# Altium footprint library transistors.PcbLib: 40 footprints (part 2 of 3)
Each footprint in its own frame and in the unit in brackets; x right, y up, seen from the top. Pads: shape width x height; smd on the part's side, far side on the other; paste and mask are expansions set on the pad; w line width, h text height; cw(c..) or ccw(c..) is an arc to the next point about the centre after c.
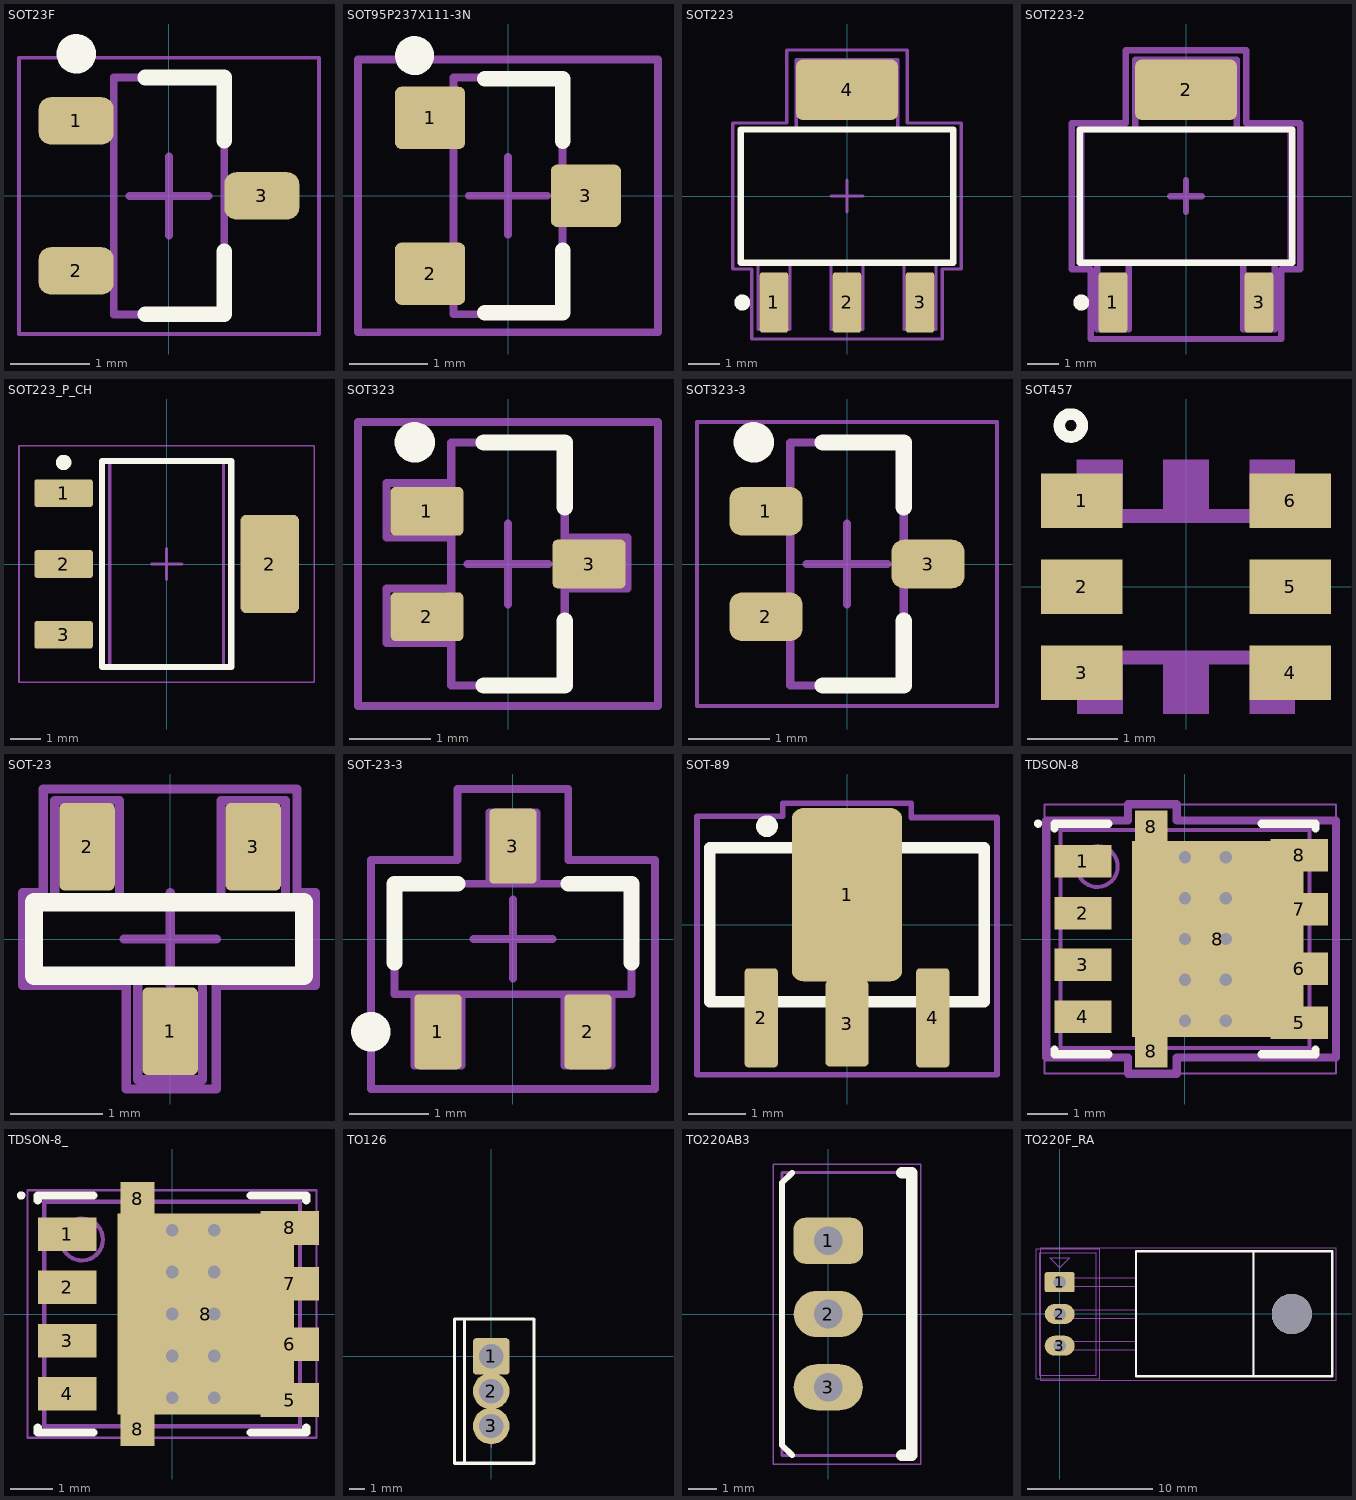
[diagram p1: the footprints below, top view; thin cyan lines are the x and y axes]

## SOT23F [mm] "SOT23-3, IPC Medium Density"
height 1.1
pads (3):
  rrect50% 0.95x0.6 smd: 1(-1.175,0.95) 2(-1.175,-0.95) 3(1.175,0)
Top Overlay:
  circle w0.25: c-1.175,1.8 r0.125
  lines w0.2: -0.3,-1.5 0.7,-1.5 0.7,-0.7 ; -0.3,1.5 0.7,1.5 0.7,0.7
Mechanical 13:
  lines w0.1: -0.7,-1.5 0.7,-1.5 0.7,1.5 -0.7,1.5 -0.7,-1.5
Mechanical 15:
  lines w0.05: -1.9,-1.75 1.9,-1.75 1.9,1.75 -1.9,1.75 -1.9,-1.75
  lines w0.1: -0.5,0 0.5,0 ; 0,-0.5 0,0.5
3D body "SOT23-3.step": height 1.3, standoff 0, extent -1.5,-1.5 1.5,1.5

## SOT95P237X111-3N [mm] "BC846ALT1G, SOT23, 3-Leads, Body 2,92x2,37mm, Pitch 0,95mm, IPC Medium Density"
height 1.11
pads (3):
  rrect20% 0.9x0.8 smd: 1(-1,1) 2(-1,-1) 3(1,0)
Top Overlay:
  circle w0.25: c-1.2,1.8 r0.125
  lines w0.2: -0.3,-1.5 0.7,-1.5 0.7,-0.7 ; -0.3,1.5 0.7,1.5 0.7,0.7
M3_comm_top:
  text ".comment" at -1.7,-0.4 h1
M5_asm_top:
  lines w0.1: -0.7,-1.52 0.7,-1.52 0.7,1.52 -0.7,1.52 -0.7,-1.52
  text ".Designator" at -1.9,2 h1
M7_courtyard_top:
  lines w0.1: -0.5,0 0.5,0 ; 0,-0.5 0,0.5 ; -1.925,-1.75 1.925,-1.75 1.925,1.75 -1.925,1.75 -1.925,-1.75
3D body "SOT95P237X111-3N.step": height 1.11, standoff 0, extent -1.32,-1.52 1.32,1.52

## SOT223 [mm] "SOT223, 4-Leads, Body 6.5x3.5mm, Pitch 2.3mm, IPC Low Density"
height 1.8
pads (4):
  rrect20% 0.9x1.9 smd: 1(-2.3,-3.35) 2(0,-3.35) 3(2.3,-3.35)
  rrect20% 3.2x1.9 smd: 4(0,3.35)
Top Overlay:
  circle w0.25: c-3.3,-3.35 r0.125
  lines w0.2: -3.35,-2.1 3.35,-2.1 3.35,2.1 -3.35,2.1 -3.35,-2.1
M3_comm_top:
  text ".comment" at -1.3,-0.3 h1
M5_asm_top:
  lines w0.1: -2.8,-2.1 -2.8,-4.2 -1.8,-4.2 -1.8,-2.1 ; -1.6,2.1 -1.6,4.1 -1.6,4.3 1.6,4.3 1.6,2.1 ; -0.5,-2.1 -0.5,-4.2 0.5,-4.2 0.5,-2.1 ; 1.8,-2.1 1.8,-4.2 2.8,-4.2 2.8,-2.1 ; -3.3,-2.1 3.3,-2.1 3.3,2.1 -3.3,2.1 -3.3,-2.1
  text ".Designator" at -1.6,4.9 h1
M7_courtyard_top:
  lines w0.1: -0.5,0 0.5,0 ; 0,-0.5 0,0.5 ; -3.6,-2.3 -3,-2.3 -3,-4.5 3,-4.5 3,-2.3 3.6,-2.3 3.6,2.3 1.9,2.3 1.9,4.6 -1.9,4.6 -1.9,2.3 -3.6,2.3 -3.6,-2.3
3D body "SOT-223-2.STEP": height 1.95, standoff 0.05, extent -3.302,-3.574 3.398,3.63

## SOT223-2 [mm] "IPN50R950CEATMA1"
height 1.8
pads (3):
  rrect20% 0.9x1.9 smd: 1(-2.3,-3.35) 3(2.3,-3.35)
  rrect20% 3.2x1.9 smd: 2(0,3.35)
Top Overlay:
  circle w0.25: c-3.3,-3.35 r0.125
  lines w0.2: -3.35,-2.1 -3.35,2.1 3.35,2.1 3.35,-2.1 -3.35,-2.1
M3_comm_top:
  text ".comment" at -3,-0.5 h2
M5_asm_top:
  lines w0.2: -2.8,-2.1 -2.8,-4.2 -1.8,-4.2 -1.8,-2.1 ; -1.6,2.1 -1.6,4.1 -1.6,4.3 1.6,4.3 1.6,2.1 ; 1.8,-2.1 1.8,-4.2 2.8,-4.2 2.8,-2.1 ; -3.3,-2.1 -3.3,2.1 3.3,2.1 3.3,-2.1 -3.3,-2.1
  text ".Designator" at -3.6,4.8 h2
M7_courtyard_top:
  lines w0.2: -0.5,0 0.5,0 ; 0,-0.5 0,0.5 ; -3.6,-2.3 -3.6,2.3 -1.9,2.3 -1.9,4.6 1.9,4.6 1.9,2.3 3.6,2.3 3.6,-2.3 3,-2.3 3,-4.5 -3,-4.5 -3,-2.3 -3.6,-2.3
3D body "SOT-223-2.STEP": height 1.95, standoff 0.05, extent -3.302,-3.574 3.398,3.63

## SOT223_P_CH [mm] "P-channel IRFL9014"
height 1.8
pads (4):
  rrect20% 1.9x0.9 smd: 1(-3.35,2.3) 2(-3.35,0) 3(-3.35,-2.3)
  rrect20% 1.9x3.2 smd: 2(3.35,0)
Top Overlay:
  circle w0.25: c-3.35,3.3 r0.125
  lines w0.2: -2.1,-3.35 -2.1,3.35 2.1,3.35 2.1,-3.35 -2.1,-3.35
Mechanical 13:
  lines w0.1: -1.85,-3.35 -1.85,3.35 1.85,3.35 1.85,-3.35 -1.85,-3.35
Mechanical 15:
  lines w0.05: -4.8,-3.85 -4.8,3.85 4.8,3.85 4.8,-3.85 -4.8,-3.85
  lines w0.1: -0.5,0 0.5,0 ; 0,-0.5 0,0.5
3D body "SOT-223-2.STEP": height 1.95, standoff 0.05, extent -3.574,-3.398 3.63,3.302

## SOT323 [mm] "1PS70SB44,115, DIODE ARRAY SCHOTTKY 40V SOT323"
height 1.1
pads (3):
  rrect20% 0.9x0.6 smd: 1(-1,0.65) 2(-1,-0.65) 3(1,0)
Top Overlay:
  circle w0.25: c-1.15,1.5 r0.125
  lines w0.2: -0.3,-1.5 0.7,-1.5 0.7,-0.7 ; -0.3,1.5 0.7,1.5 0.7,0.7
M3_comm_top:
  text ".comment" at -1.7,-0.4 h1
M5_asm_top:
  lines w0.1: -0.75,-0.3 -1.5,-0.3 -1.5,-0.975 -0.7,-0.975 ; -0.725,1 -1.5,1 -1.5,0.325 -0.7,0.325 ; 0.7,-0.3 1.475,-0.3 1.475,0.325 0.7,0.325 ; -0.7,-1.5 -0.7,1.5 0.7,1.5 0.7,-1.5 -0.7,-1.5
  text ".Designator" at -1.875,1.8 h1
M7_courtyard_top:
  lines w0.1: -0.5,0 0.5,0 ; 0,-0.5 0,0.5 ; -1.85,-1.75 1.85,-1.75 1.85,1.75 -1.85,1.75 -1.85,-1.75
Mechanical 13:
  lines w0.1: -0.7,-1.5 0.7,-1.5 0.7,1.5 -0.7,1.5 -0.7,-1.5
Mechanical 15:
  lines w0.1: -0.5,0 0.5,0 ; 0,-0.5 0,0.5
3D body "SOT323 (SC70-3)-1.STEP": height 1.1, standoff 0, extent -1.122,-1.1 1.123,1.1

## SOT323-3 [mm] "SOT323-3, IPC Medium Density"
height 1.1
pads (3):
  rrect50% 0.9x0.6 smd: 1(-1,0.65) 2(-1,-0.65) 3(1,0)
Top Overlay:
  circle w0.25: c-1.15,1.5 r0.125
  lines w0.2: -0.3,-1.5 0.7,-1.5 0.7,-0.7 ; -0.3,1.5 0.7,1.5 0.7,0.7
Mechanical 13:
  lines w0.1: -0.7,-1.5 -0.7,1.5 0.7,1.5 0.7,-1.5 -0.7,-1.5
Mechanical 15:
  lines w0.05: -1.85,-1.75 -1.85,1.75 1.85,1.75 1.85,-1.75 -1.85,-1.75
  lines w0.1: -0.5,0 0.5,0 ; 0,-0.5 0,0.5
3D body "SOT323 (SC70-3)-1.STEP": height 1.1, standoff 0, extent -1.122,-1.1 1.123,1.1

## SOT457 [mm]
pads (6):
  rect 0.9x0.6 smd: 1(-1.15,0.95) 2(-1.15,0) 3(-1.15,-0.95) 4(1.15,-0.95) 5(1.15,0) 6(1.15,0.95)
Top Overlay:
  circle w0.127: c-1.27,1.778 r0.127
M1_3D_TOP:
  region: -1.203,1.4 -0.7,1.4 -0.7,0.802 -1.203,0.802
  region: -0.25,1.4 0.25,1.4 0.25,0.801 -0.25,0.801
  region: 0.701,1.4 1.2,1.4 1.2,0.801 0.701,0.801
  region: 0.701,-0.8 1.2,-0.8 1.2,-1.403 0.701,-1.403
  region: -0.25,-0.8 0.25,-0.8 0.25,-1.402 -0.25,-1.402
  region: -1.201,-0.8 -0.7,-0.8 -0.7,-1.401 -1.201,-1.401
  lines w0.152: -1.423,-0.781 1.422,-0.781 ; -1.423,0.781 1.422,0.781

## SOT-23 [mm] "SENSOR HALL EFFECT ANALOG SOT23"
height 1.1
pads (3):
  rrect20% 0.6x0.95 smd mask+0.05: 1(0,-1) 2(-0.9,1) 3(0.9,1)
Top Overlay:
  lines w0.2: -1.475,-0.4 -1.475,0.4 1.45,0.4 1.45,-0.4 -1.475,-0.4
M3_comm_top:
  text ".comment" at -1.7,-0.4 h1
M5_asm_top:
  lines w0.1: -1.25,0.4 -1.25,1.5 -0.55,1.5 -0.55,0.4 ; -0.35,-0.4 -0.35,-1.525 0.35,-1.525 0.35,-0.4 ; 0.55,0.4 0.55,0.8 0.55,1.5 1.25,1.5 1.25,0.4 ; -1.475,-0.4 -1.475,0.4 1.45,0.4 1.45,-0.4 -1.475,-0.4
  text ".Designator" at -1.425,1.7 h1
M7_courtyard_top:
  lines w0.1: -0.5,0 0.5,0 ; 0,-0.5 0,0.5 ; -1.6,-0.5 -1.6,0.5 -1.375,0.5 -1.375,1.625 1.375,1.625 1.375,0.5 1.575,0.5 1.575,-0.5 0.5,-0.5 0.5,-1.625 -0.1,-1.625 -0.475,-1.625 -0.475,-0.5 -1.6,-0.5
3D body "User Library-sot23-1.STEP": height 1, standoff 0, extent -1.46,-1.17 1.46,1.17

## SOT-23-3 [mm] "TL431IDBZR, MMBT3904. SOT23-3, IPC Medium Density"
height 1.1
pads (3):
  rrect20% 0.6x0.95 smd mask+0.05: 1(-0.95,-1.175) 2(0.95,-1.175) 3(0,1.175)
Top Overlay:
  circle w0.25: c-1.8,-1.175 r0.125
  lines w0.2: -1.5,-0.3 -1.5,0.7 -0.7,0.7 ; 0.7,0.7 1.5,0.7 1.5,-0.3
M3_comm_top:
  text ".comment" at 0,0 h1
M5_asm_top:
  lines w0.1: -1.25,-0.7 -1.25,-1.6 -0.65,-1.6 -0.65,-0.7 ; -0.3,0.7 -0.3,1.6 0.3,1.6 0.3,0.7 ; 0.65,-0.7 0.65,-1.6 1.25,-1.6 1.25,-0.7 ; -1.5,-0.7 1.5,-0.7 1.5,0.7 -1.5,0.7 -1.5,-0.7
  text ".Designator" at -1.9,2 h1
M7_courtyard_top:
  lines w0.1: -0.5,0 0.5,0 ; 0,-0.5 0,0.5 ; 1.75,-1.9 -1.8,-1.9 -1.8,1 -0.7,1 -0.7,1.9 0.7,1.9 0.7,1 1.8,1 1.8,-1.9
3D body "SOT23-3.step": height 1.3, standoff 0, extent -1.5,-1.5 1.5,1.5

## SOT-89 [mm] "BCX5416TA"
height 1.1
pads (4):
  rrect20% 1.933x3.03 smd mask+0.05: 1(0,0.525)
  rrect20% 0.58x1.73 smd mask+0.05: 2(-1.5,-1.63) 4(1.5,-1.63)
  rrect20% 0.76x1.5 smd mask+0.05: 3(0,-1.73)
Top Overlay:
  circle w0.2: c-1.4,1.725 r0.09
  lines w0.2: -2.4,-1.35 -2.4,1.35 2.4,1.35 2.4,-1.35 -2.4,-1.35
M3_comm_top:
  text ".comment" at 0,0 h1
M5_asm_top:
  circle w0.1: c-1.4,1.725 r0.135
  lines w0.1: -2.375,1.325 -2.37,1.325 ; -2.4,-1.35 -2.4,1.35 2.4,1.35 2.4,-1.35 -2.4,-1.35
  text ".Designator" at -1.9,2.275 h1
M7_courtyard_top:
  lines w0.1: -0.5,0 0.5,0 ; 0,-0.5 0,0.5 ; -2.625,-2.625 2.625,-2.625 2.625,1.875 1.125,1.875 1.125,2.125 -1.125,2.125 -1.125,1.9 -2.625,1.9 -2.625,-2.625
3D body "CircuitWorks-SOT-89.STEP": height 1.5, standoff 0, extent -2.25,-2.25 2.25,1.75

## TDSON-8 [mm] "PSON, IPC Medium Density"
height 1.1
pads (11):
  rect 1.4x0.8 smd mask+0: 1(-2.5,1.905) 2(-2.5,0.635) 3(-2.5,-0.635) 4(-2.5,-1.905) 5(2.8,-2.05) 6(2.8,-0.725) 7(2.8,0.725) 8(2.8,2.05)
  rect 0.8x0.8 smd mask+0: 8(-0.825,-2.75) 8(-0.825,2.75)
  rect 4.2x4.8 smd paste-2.575 mask+0: 8(0.8,0)
via 1,-2 diameter 0.7 hole 0.3
via 0,-2 diameter 0.7 hole 0.3
via 1,-1 diameter 0.7 hole 0.3
via 0,-1 diameter 0.7 hole 0.3
via 1,0 diameter 0.7 hole 0.3
via 0,0 diameter 0.7 hole 0.3
via 1,1 diameter 0.7 hole 0.3
via 0,1 diameter 0.7 hole 0.3
via 1,2 diameter 0.7 hole 0.3
via 0,2 diameter 0.7 hole 0.3
Top Overlay:
  circle w0.1: c-3.6,2.825 r0.05
  lines w0.2: -3.2,-2.705 -3.2,-2.825 -1.875,-2.825 ; -3.2,2.705 -3.2,2.825 -1.875,2.825 ; 1.875,-2.825 3.2,-2.825 3.2,-2.705 ; 1.875,2.825 3.2,2.825 3.2,2.705
Top Paste:
  rectangle: -1.05,1.28 0.25,2.26
  rectangle: -1.05,0.1 0.25,1.08
  rectangle: -1.05,-1.08 0.25,-0.1
  rectangle: -1.05,-2.26 0.25,-1.28
  rectangle: 0.425,1.28 1.55,2.26
  rectangle: 0.425,0.1 1.55,1.08
  rectangle: 0.425,-1.08 1.55,-0.1
  rectangle: 0.425,-2.26 1.55,-1.28
M3_comm_top:
  text ".comment" at -2.6,-0.7 h2
M5_asm_top:
  text ".Designator" at -2.1,0.6 h2
M7_courtyard_top:
  lines w0.2: -0.5,0 0.5,0 ; 0,-0.5 0,0.5 ; -3.4,-2.9 -3.4,2.9 -1.4,2.9 -1.4,3.3 -0.2,3.3 -0.2,2.9 3.7,2.9 3.7,-2.9 -0.2,-2.9 -0.2,-3.3 -1.4,-3.3 -1.4,-2.9 -3.4,-2.9
Mechanical 13:
  circle w0.1: c-2.15,1.775 r0.5
  lines w0.1: -3.05,-2.675 -3.05,2.675 3.05,2.675 3.05,-2.675 -3.05,-2.675
Mechanical 15:
  lines w0.05: -3.445,-3.3 -3.445,3.3 3.7,3.3 3.7,-3.3 -3.445,-3.3
  lines w0.1: -0.5,0 0.5,0 ; 0,-0.5 0,0.5
3D body "TDSON-8 (INFIN).step": height 1.1, standoff -0.01, extent -3.175,-2.795 3.175,2.795

## TDSON-8_ [mm] "PSON, IPC Medium Density"
height 1.1
pads (11):
  rect 1.4x0.8 smd mask+0: 1(-2.5,1.905) 2(-2.5,0.635) 3(-2.5,-0.635) 4(-2.5,-1.905) 5(2.8,-2.05) 6(2.8,-0.725) 7(2.8,0.725) 8(2.8,2.05)
  rect 0.8x0.8 smd mask+0: 8(-0.825,-2.75) 8(-0.825,2.75)
  rect 4.2x4.8 smd paste-2.575 mask+0: 8(0.8,0)
via 1,-2 diameter 0.6 hole 0.3
via 0,-2 diameter 0.6 hole 0.3
via 1,-1 diameter 0.6 hole 0.3
via 0,-1 diameter 0.6 hole 0.3
via 1,0 diameter 0.6 hole 0.3
via 0,0 diameter 0.6 hole 0.3
via 1,1 diameter 0.6 hole 0.3
via 0,1 diameter 0.6 hole 0.3
via 1,2 diameter 0.6 hole 0.3
via 0,2 diameter 0.6 hole 0.3
Top Overlay:
  circle w0.1: c-3.6,2.825 r0.05
  lines w0.2: -3.2,-2.705 -3.2,-2.825 -1.875,-2.825 ; -3.2,2.705 -3.2,2.825 -1.875,2.825 ; 1.875,-2.825 3.2,-2.825 3.2,-2.705 ; 1.875,2.825 3.2,2.825 3.2,2.705
Top Paste:
  rectangle: -1.05,1.28 0.25,2.26
  rectangle: -1.05,0.1 0.25,1.08
  rectangle: -1.05,-1.08 0.25,-0.1
  rectangle: -1.05,-2.26 0.25,-1.28
  rectangle: 0.425,1.28 1.55,2.26
  rectangle: 0.425,0.1 1.55,1.08
  rectangle: 0.425,-1.08 1.55,-0.1
  rectangle: 0.425,-2.26 1.55,-1.28
Mechanical 13:
  circle w0.1: c-2.15,1.775 r0.5
  lines w0.1: -3.05,-2.675 -3.05,2.675 3.05,2.675 3.05,-2.675 -3.05,-2.675
Mechanical 15:
  lines w0.05: -3.445,-2.95 -3.445,2.95 3.445,2.95 3.445,-2.95 -3.445,-2.95
  lines w0.1: -0.5,0 0.5,0 ; 0,-0.5 0,0.5
3D body "TDSON-8 (INFIN).step": height 1.1, standoff -0.01, extent -3.175,-2.795 3.175,2.795

## TO126 [mm] "APT13003EU-G1. TRANS NPN 465V 1.5A TO126"
height 2.4
pads (3):
  rrect20% 2.4x2.4 hole 1.6: 1(0,0)
  round 2.4 hole 1.6: 2(0,-2.28) 3(0,-4.56)
Top Overlay:
  lines w0.1: -1.775,2.425 -1.75,2.425
  lines w0.2: -1.75,-7 -1.75,2.425 ; -2.4,-7 -2.4,2.44 2.45,2.44 2.8,2.44 2.8,-7 -2.4,-7
M1_3D_TOP:
  region: 4.6,12.6
M3_comm_top:
  text ".comment" at 0.1,-0.2 h1
M5_asm_top:
  lines w0.1: -1.75,-7.05 -1.75,2.425 ; 2.8,-6.6 2.8,-7 ; 2.8,-7 2.8,2.44 ; 2.8,-7 2.8,-7 ; 2.8,-7 -2.4,-7 -2.4,2.44 2.8,2.44 ; 2.8,-7 2.8,-7 ; 2.8,2.44 2.8,2.44
  text ".Designator" at -1.5,2.84 h1
M7_courtyard_top:
  lines w0.1: -0.5,0 0.5,0 ; 0,-0.525 0,0.475 ; 2.8,-7 2.8,2.44 -2.4,2.44 -2.4,-7 2.8,-7 ; 2.8,-7 2.8,-7
Mechanical 13:
  lines w0.1: -2.4,2.44 2.9,2.44
Mechanical 15:
  lines w0.1: -0.5,-5.46 0.5,-5.46 ; 0,-5.96 0,-4.96
3D body "ALSRobot-TO-126.STEP": height 10.94, standoff -16.86, extent -1.425,-6.375 1.825,1.625

## TO220AB3 [mm] "DPAK, IPC"
height 2.4
pads (3):
  rrect50% 2.4x1.6 hole 1: 1(0,2.54)
  oval 2.4x1.6 hole 1: 2(0,0) 3(0,-2.54)
Top Overlay:
  lines w0.2: -1.25,-4.9 -1.6,-4.55 -1.6,4.55 -1.25,4.9
  lines w0.4: 2.55,-4.9 2.9,-4.9 2.9,4.9 2.55,4.9
Mechanical 13:
  lines w0.1: -1.6,-4.9 -1.6,4.9 2.907,4.9 2.907,-4.9 -1.6,-4.9
Mechanical 15:
  lines w0.05: -1.9,-5.2 -1.9,5.2 3.2,5.2 3.2,-5.2 -1.9,-5.2
  lines w0.1: -0.5,0 0.5,0 ; 0,-0.5 0,0.5
3D body "TO220-A PCB.step": height 19.99, standoff -3.5, extent -1.55,-4.95 2.907,4.95

## TO220F_RA [mm] "2SK2842"
height 2.4
pads (4):
  rrect20% 2.4x1.6 hole 1: 1(0,2.54)
  oval 2.4x1.6 hole 1: 2(0,0) 3(0,-2.54)
  round 3.2 hole 3.2 unplated: ""(18.56,0)
Top Overlay:
  circle w0.2: c18.565,0 r1.5
  lines w0.2: 15.5,-5 15.5,5 ; 6.1,-5 6.1,5 21.8,5 21.8,-5 6.1,-5
M3_comm_top:
  text ".comment" at 6.8,2.6 h1
M5_asm_top:
  circle w0.1: c18.565,0 r1.5
  lines w0.1: 6.1,-2.88 0,-2.88 0,-2.18 6.1,-2.18 ; 6.1,-0.34 0,-0.34 0,0.36 6.1,0.36 ; 6.1,2.2 0,2.2 0,2.9 6.1,2.9 ; 15.5,-5 15.5,5 ; -0.8,4.5 0,3.7 0.8,4.5 -0.8,4.5 ; 6.1,-5 21.8,-5 21.8,5 6.1,5 6.1,-5
  text ".Designator" at 9.1,1.9 h1
M7_courtyard_top:
  lines w0.1: -0.5,0 0.5,0 ; 0,-0.5 0,0.5 ; -1.5,-5.3 22.1,-5.3 22.1,5.3 -1.5,5.3 -1.5,-5.3
Mechanical 13:
  lines w0.1: -1.6,-4.9 -1.6,4.9 2.907,4.9 2.907,-4.9 -1.6,-4.9
Mechanical 15:
  lines w0.05: -1.9,-5.2 -1.9,5.2 3.2,5.2 3.2,-5.2 -1.9,-5.2
  lines w0.1: -0.5,0 0.5,0 ; 0,-0.5 0,0.5
3D body "2SK2842_cutted.STEP": height 4.78, standoff 0.03, extent 0,-5.07 21.87,5.07